# Altium footprint library Indruino.PcbLib: 383 footprints (part 24 of 24)
Each footprint in its own frame and in the unit in brackets; x right, y up, seen from the top. Pads: shape width x height; smd on the part's side, far side on the other; paste and mask are expansions set on the pad; w line width, h text height; cw(c..) or ccw(c..) is an arc to the next point about the centre after c.
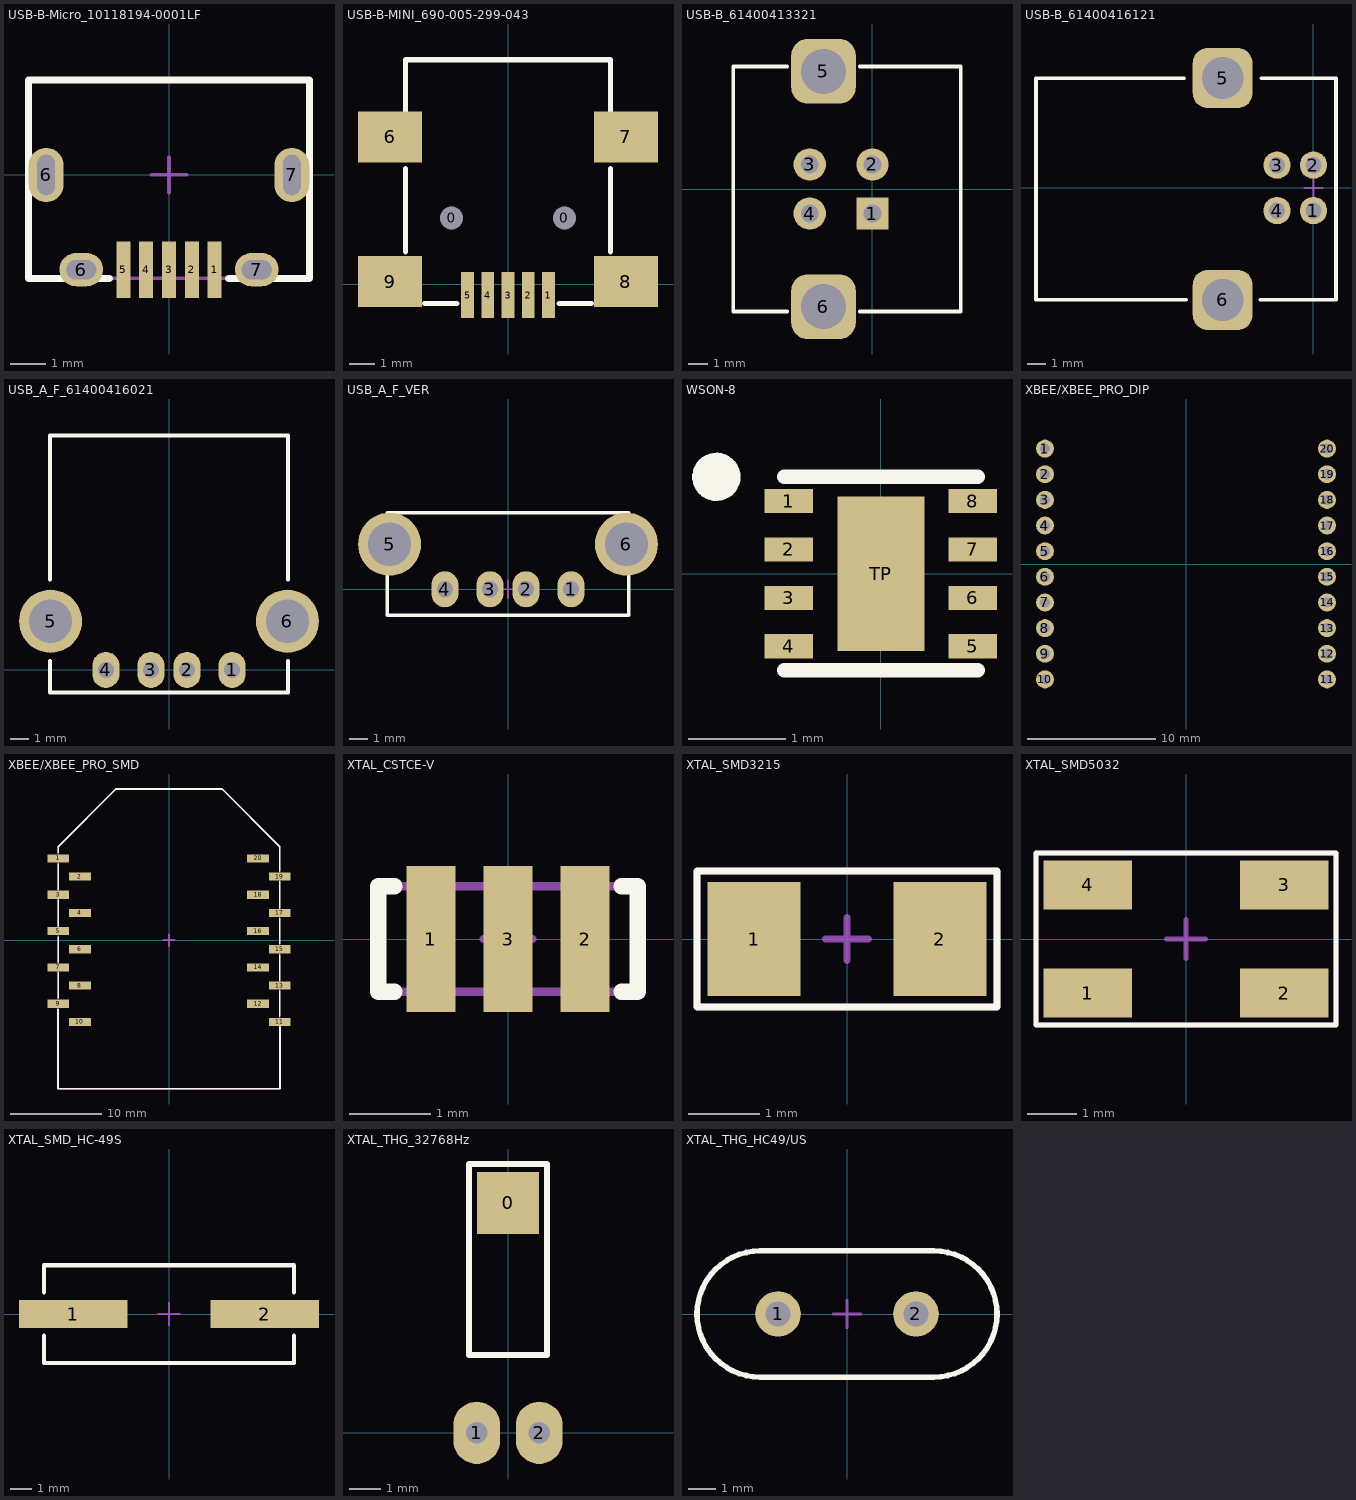
[diagram p23: the footprints below, top view; thin cyan lines are the x and y axes]

## USB-B-Micro_10118194-0001LF [mm]
pads (9):
  rect 0.4x1.6 smd: 1(1.3,-2.7) 2(0.65,-2.7) 3(0,-2.7) 4(-0.65,-2.7) 5(-1.3,-2.7)
  oval 1x1.55 hole 1.15 slot 0.5 at 0 deg: 6(-3.5,0) 7(3.5,0)
  oval 1.25x0.95 hole 0.85 slot 0.55 at 90 deg: 6(-2.5,-2.7) 7(2.5,-2.7)
Top Overlay:
  lines w0.2: -1.7,-2.95 -4,-2.95 -4,-0.95 -4,2.7 4,2.7 4,-0.95 4,-2.95 1.7,-2.95
Mechanical 13:
  lines w0.1: -4,-2.95 4,-2.95 4,-0.95 4,2.7 -4,2.7 -4,-0.95 -4,-2.95
Mechanical 15:
  lines w0.1: -0.5,0 0.5,0 ; 0,-0.5 0,0.5
3D body "10118194c.stp": height 2.72, standoff -0.55, extent -4.025,-2.88 4.025,2.7

## USB-B-MINI_690-005-299-043 [mm]
pads (11):
  round 0.7 hole 0.9: 0(-2.2,2.58) 0(2.2,2.58)
  rect 0.5x1.8 smd: 1(1.575,-0.431) 2(0.787,-0.431) 3(0,-0.431) 4(-0.787,-0.431) 5(-1.575,-0.431)
  rect 2.5x2 smd: 6(-4.6,5.74) 7(4.6,5.74) 8(4.6,0.1) 9(-4.6,0.1)
Top Overlay:
  lines w0.2: -4,1.25 -4,4.5 ; -4,6.75 -4,8.75 4,8.75 4,6.75 ; -3.25,-0.75 -2,-0.75 ; 2,-0.75 3.25,-0.75 ; 4,1.25 4,4.5
3D body "User Library-USB_mini_B.step": height 3.95, standoff -1, extent -5.35,-0.673 5.35,8.527

## USB-B_61400413321 [mm]
pads (6):
  rect 1.65x1.65 hole 0.9: 1(0,-1.25)
  round 1.65 hole 0.9: 2(0,1.25) 3(-3.2,1.25) 4(-3.2,-1.25)
  rrect50% 3.3x3.3 hole 2.3: 5(-2.5,6) 6(-2.5,-6)
Top Overlay:
  lines w0.2: -4.35,-6.25 -7.1,-6.25 -7.1,6.25 -4.35,6.25 ; -0.65,-6.25 4.5,-6.25 4.5,6.25 -0.65,6.25
3D body "5787834-1.stp": height 15.82, standoff -3.82, extent -7.053,-7.57 4.403,7.58

## USB-B_61400416121 [mm]
pads (6):
  round 1.5 hole 0.9: 1(0,-1.25) 2(0,1.25) 3(-2,1.25) 4(-2,-1.25)
  rrect50% 3.3x3.3 hole 2.3: 5(-4.988,6.033) 6(-4.988,-6.159)
Top Overlay:
  lines w0.2: -7.103,6.033 -15.25,6.033 -15.25,-6.159 -7.001,-6.159 ; -2.924,-6.159 1.24,-6.159 1.24,6.033 -2.868,6.033
Mechanical 15:
  lines w0.1: -0.5,0 0.5,0 ; 0,-0.5 0,0.5
3D body "STEP-61400416121-rev1.stp": height 11.08, standoff -3.78, extent -15.25,-7.484 1.25,7.484

## USB_A_F_61400416021 [mm] "Wurth, USB - A USB 2.0 Receptacle Connector 4 Position Through Hole, Right Angle"
height 6.8
pads (6):
  oval 1.5x2 hole 0.9: 1(3.5,0) 2(1,0) 3(-1,0) 4(-3.5,0)
  round 3.5 hole 2.4: 5(-6.57,2.7) 6(6.57,2.7)
Top Overlay:
  lines w0.2: -6.6,0.5 -6.6,-1.25 6.6,-1.25 6.6,0.5 ; -6.6,5 -6.6,13 6.6,13 6.6,5
3D body "61400416021.stp": height 7.76, standoff -3.64, extent -7.901,-1.12 7.901,12.98

## USB_A_F_VER [mm] "Type A Female USB Connector, Vertical PCB"
pads (6):
  oval 1.5x2 hole 0.9: 1(3.5,0) 2(1,0) 3(-1,0) 4(-3.5,0)
  round 3.5 hole 2.4: 5(-6.57,2.5) 6(6.57,2.5)
Top Overlay:
  lines w0.2: -6.7,-1.45 -6.7,4.25 6.7,4.25 6.7,-1.45 -6.7,-1.45
Mechanical 15:
  lines w0.1: -0.5,0 0.5,0 ; 0,-0.5 0,0.5
3D body "43749.stp": height 15, standoff -3.8, extent -7.849,-2.06 7.85,4.78

## WSON-8 [mm] "WSON-8 leads, 2x2mm, Pitch 0.5mm"
height 0.8
pads (9):
  rect 0.5x0.25 smd: 1(-0.95,0.75) 2(-0.95,0.25) 3(-0.95,-0.25) 4(-0.95,-0.75) 5(0.95,-0.75) 6(0.95,-0.25) 7(0.95,0.25) 8(0.95,0.75)
  rect 0.9x1.6 smd: TP(0,0)
Top Overlay:
  circle w0.1: c-1.7,1 r0.2
  region: -1.7,0.8 -1.74,0.8 -1.813,0.83 -1.87,0.887 -1.9,0.96 -1.9,1 -1.9,1.04 -1.87,1.113 -1.813,1.17 -1.74,1.2 -1.7,1.2 -1.66,1.2 -1.587,1.17 -1.53,1.113 -1.5,1.04 -1.5,1 -1.5,0.96 -1.53,0.887 -1.587,0.83 -1.66,0.8
  lines w0.15: -1,-1 1,-1 ; -1,1 1,1
Mechanical 15:
  lines w0.1: -0.2,0 0.2,0 ; 0,-0.2 0,0.2
3D body: height 0.8, standoff 0, extent -1,-1 1,1

## XBEE/XBEE_PRO_DIP [mm] "XBEE® S2C 802.15.4  RF MODULES"
height 4
pads (20):
  round 1.4 hole 0.8: 1(-11,9) 2(-11,7) 3(-11,5) 4(-11,3) 5(-11,1) 6(-11,-1) 7(-11,-3) 8(-11,-5) 9(-11,-7) 10(-11,-9) 11(11,-9) 12(11,-7) 13(11,-5) 14(11,-3) 15(11,-1) 16(11,1) 17(11,3) 18(11,5) 19(11,7) 20(11,9)
3D body "User Library-XBeeProS1_Stepfile.STEP": height 4.44, standoff -3.06, extent -11.885,-16.22 11.845,16.72

## XBEE/XBEE_PRO_SMD [mm] "XBEE® S2C 802.15.4  RF MODULES"
height 4
pads (20):
  rect 2.4x0.9 smd: 1(-12.2,9) 2(-9.8,7) 3(-12.2,5) 4(-9.8,3) 5(-12.2,1) 6(-9.8,-1) 7(-12.2,-3) 8(-9.8,-5) 9(-12.2,-7) 10(-9.8,-9) 11(12.2,-9) 12(9.8,-7) 13(12.2,-5) 14(9.8,-3) 15(12.2,-1) 16(9.8,1) 17(12.2,3) 18(9.8,5) 19(12.2,7) 20(9.8,9)
Top Overlay:
  lines w0.2: -12.2,-7.62 -12.2,-16.35 12.2,-16.35 12.2,-9.525 ; -12.192,-6.35 -12.192,-3.556 ; -12.192,-2.413 -12.192,0.381 ; -12.192,1.524 -12.192,4.445 ; -12.192,5.588 -12.192,8.382 ; -12.192,9.652 -12.192,10.287 -5.842,16.637 5.842,16.637 12.192,10.287 12.192,7.62 ; 12.192,-8.382 12.192,-5.588 ; 12.192,-4.445 12.192,-1.651 ; 12.192,-0.381 12.192,2.413 ; 12.192,3.556 12.192,6.477
Mechanical 13:
  lines w0.1: -12.192,-16.383 12.192,-16.383 12.192,10.287 5.842,16.637 -5.842,16.637 -12.192,10.287 -12.192,-16.383
Mechanical 15:
  lines w0.2: -0.635,0 0.635,0 ; 0,-0.635 0,0.635
3D body "SW3dPS-XBEE Pro.STEP": height 9.5, standoff -4.09, extent -12.19,-16.34 12.19,16.6
3D body "female_header_a-bl200-eg-g10mp1.stp": height 4.48, standoff -0.02, extent -13.05,-10.25 -8.95,10.25
3D body "female_header_a-bl200-eg-g10mp1.stp": height 4.48, standoff -0.02, extent 8.95,-10.25 13.05,10.25

## XTAL_CSTCE-V [mm] "Murata, Chip Resonator,CSTCE-V Series, Body 3.2x1.3mm"
height 1
pads (3):
  rect 0.6x1.8 smd: 1(-0.95,0) 2(0.95,0) 3(0,0)
Top Overlay:
  lines w0.2: -1.4,-0.65 -1.6,-0.65 -1.6,0.65 -1.4,0.65 ; 1.4,-0.65 1.6,-0.65 1.6,0.65 1.4,0.65
Mechanical 13:
  lines w0.1: -1.6,-0.65 1.6,-0.65 1.6,0.65 -1.6,0.65 -1.6,-0.65
Mechanical 15:
  lines w0.1: -0.3,0 0.3,0 ; 0,-0.3 0,0.3 ; -1.6,-0.65 -1.6,0.65 1.6,0.65 1.6,-0.65 -1.6,-0.65
3D body "SW3dPS-CSTCE_V-1.STEP": height 1.02, standoff -0.09, extent -1.6,-0.65 1.6,0.65

## XTAL_SMD3215 [mm]
pads (2):
  rect 1.3x1.6 smd: 1(-1.3,0) 2(1.3,0)
Top Overlay:
  lines w0.1: -2.1,-0.95 2.1,-0.95 2.1,0.95 -2.1,0.95 -2.1,-0.95
Mechanical 13:
  lines w0.1: -2.1,-0.95 2.1,-0.95 2.1,0.95 -2.1,0.95 -2.1,-0.95
Mechanical 15:
  lines w0.1: -0.3,0 0.3,0 ; 0,-0.3 0,0.3
3D body "User Library-Siward_SX3215.STEP": height 0.81, standoff 0, extent -1.6,-0.75 1.6,0.75

## XTAL_SMD5032 [mm]
pads (4):
  rect 1.8x1 smd: 1(-2,-1.1) 2(2,-1.1) 3(2,1.1) 4(-2,1.1)
Top Overlay:
  lines w0.1: -3.05,-1.75 -3.05,1.75 3.05,1.75 3.05,-1.75 -3.05,-1.75
Mechanical 13:
  lines w0.1: -3.05,-1.75 3.05,-1.75 3.05,1.75 -3.05,1.75 -3.05,-1.75
Mechanical 15:
  lines w0.1: -0.4,0 0.4,0 ; 0,-0.4 0,0.4
3D body "User Library-Crystal.STEP": height 0.9, standoff -0.05, extent -2.475,-1.6 2.525,1.6

## XTAL_SMD_HC-49S [mm]
pads (2):
  rect 5x1.3 smd: 1(-4.4,0.001) 2(4.4,0.001)
Top Overlay:
  lines w0.2: -5.75,-1 -5.75,-2.25 5.75,-2.25 5.75,-1 ; -5.75,1 -5.75,2.25 5.75,2.25 5.75,1
Mechanical 15:
  lines w0.1: -0.5,0 0.5,0 ; 0,-0.5 0,0.5
3D body "User Library-HC49_SMD.STEP": height 5.18, standoff 0, extent -6.15,-2.25 6.15,2.25

## XTAL_THG_32768Hz [mm]
pads (3):
  rect 2x2 smd: 0(0,7.375)
  oval 1.5x2 hole 0.7: 1(-1,0) 2(1,0)
Top Overlay:
  lines w0.2: -1.25,2.5 1.25,2.5 1.25,8.625 -1.25,8.625 -1.25,2.5
3D body "User Library-DT-26-1.step": height 2.1, standoff -1.9, extent -1,-0.125 1,7.015

## XTAL_THG_HC49/US [mm]
pads (2):
  round 1.65 hole 0.9: 1(-2.5,0.001) 2(2.5,0.001)
Top Overlay:
  lines w0.2: -3.15,-2.286 cw(c-3.15,0) -3.15,2.286 3.15,2.286 cw(c3.15,0) 3.15,-2.286 -3.15,-2.286
Mechanical 15:
  lines w0.1: -0.5,0 0.5,0 ; 0,-0.5 0,0.5
3D body "ABL.STEP": height 3.25, standoff -5.75, extent -5.75,-2.5 5.75,2.5